# Altium footprint library kalios.PcbLib: 404 footprints (part 16 of 26)
Each footprint in its own frame and in the unit in brackets; x right, y up, seen from the top. Pads: shape width x height; smd on the part's side, far side on the other; paste and mask are expansions set on the pad; w line width, h text height; cw(c..) or ccw(c..) is an arc to the next point about the centre after c.
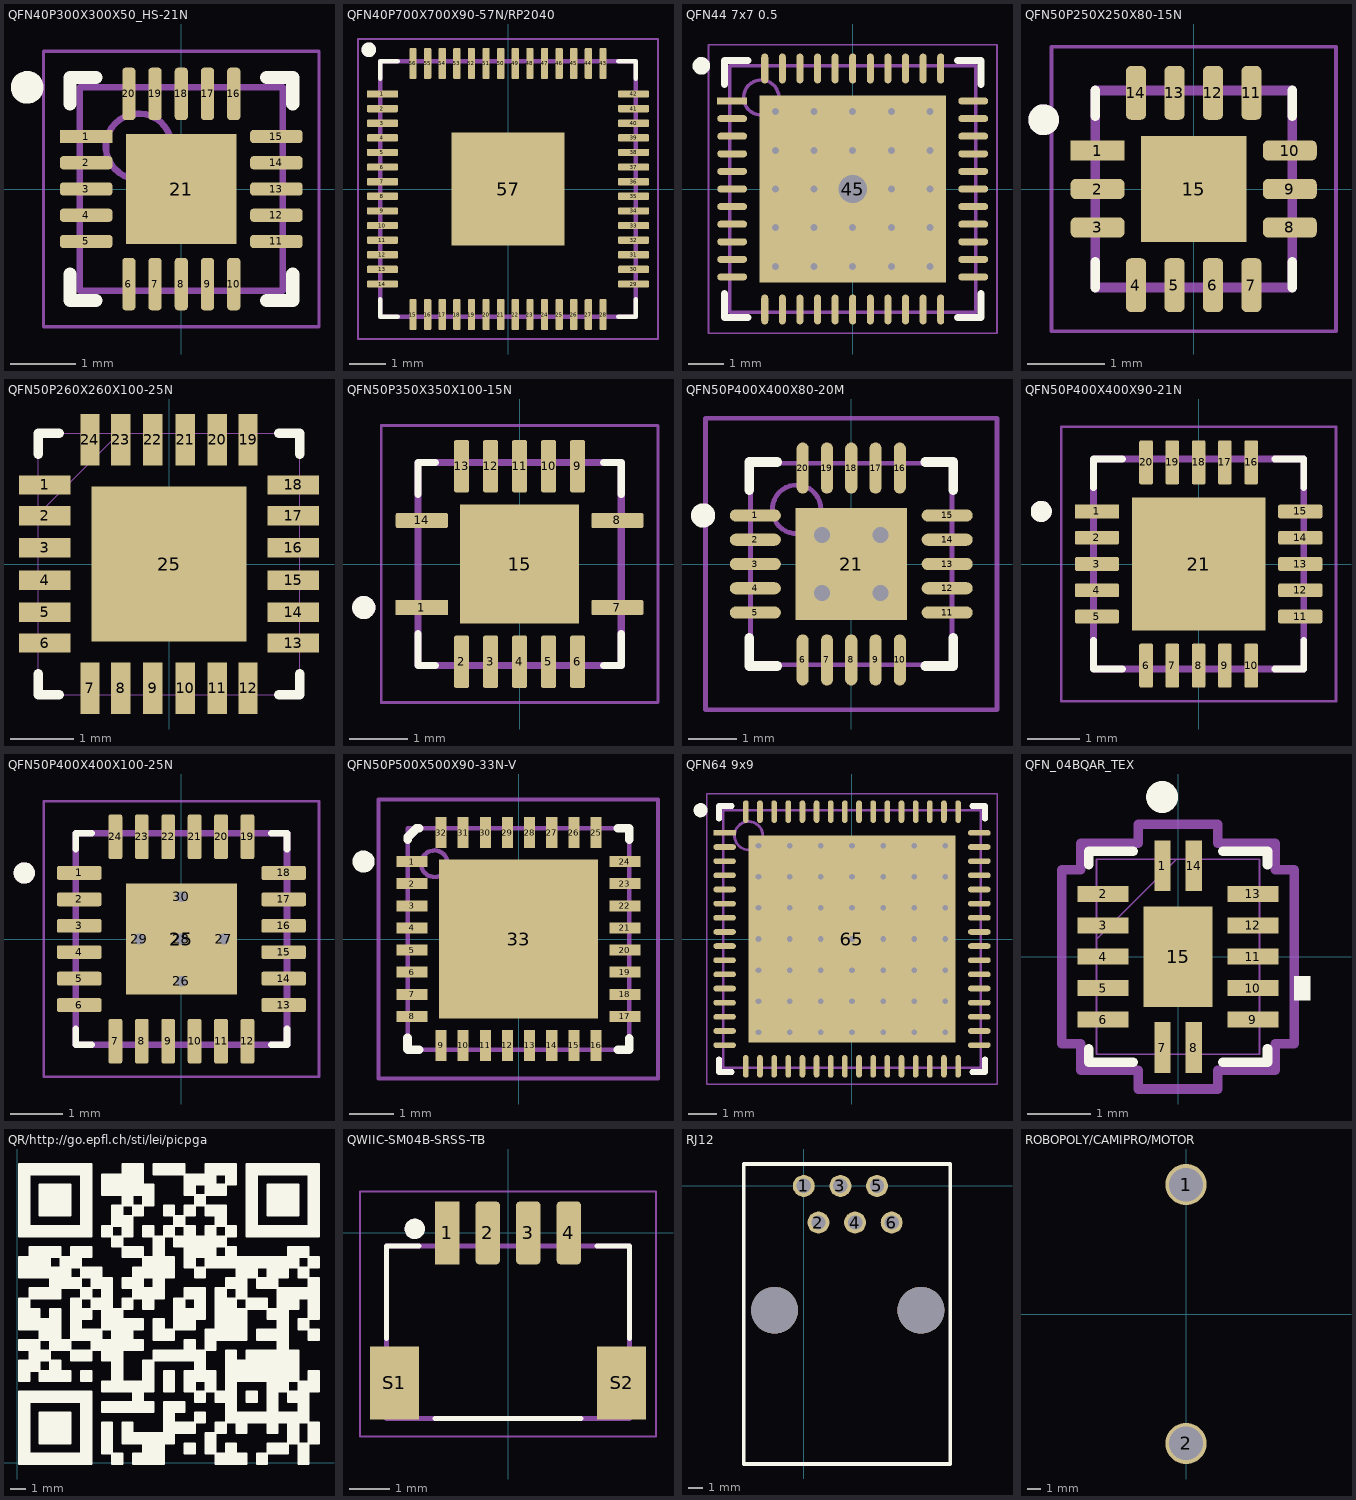
[diagram p15: the footprints below, top view; thin cyan lines are the x and y axes]

## QFN40P300X300X50_HS-21N [mm] "QFN, 20-Leads, Body 3.00x3.00mm, Pitch 0.40mm, Thermal Pad 1.68x1.68mm, IPC Medium Density"
height 0.5
pads (21):
  rect 0.8x0.2 smd: 1(-1.45,0.8)
  rrect50% 0.8x0.2 smd: 2(-1.45,0.4) 3(-1.45,0) 4(-1.45,-0.4) 5(-1.45,-0.8) 11(1.45,-0.8) 12(1.45,-0.4) 13(1.45,0) 14(1.45,0.4) 15(1.45,0.8)
  rrect50% 0.2x0.8 smd: 6(-0.8,-1.45) 7(-0.4,-1.45) 8(0,-1.45) 9(0.4,-1.45) 10(0.8,-1.45) 16(0.8,1.45) 17(0.4,1.45) 18(0,1.45) 19(-0.4,1.45) 20(-0.8,1.45)
  rect 1.68x1.68 smd: 21(0,0)
Top Overlay:
  circle w0.25: c-2.35,1.55 r0.125
  lines w0.2: -1.7,-1.3 -1.7,-1.7 -1.3,-1.7 ; -1.7,1.3 -1.7,1.7 -1.3,1.7 ; 1.3,-1.7 1.7,-1.7 1.7,-1.3 ; 1.3,1.7 1.7,1.7 1.7,1.3
Top 3D Body:
  circle w0.1: c-0.65,0.65 r0.5
  lines w0.1: -1.55,-1.55 -1.55,1.55 1.55,1.55 1.55,-1.55 -1.55,-1.55
Top Courtyard:
  lines w0.05: -2.1,-2.1 -2.1,2.1 2.1,2.1 2.1,-2.1 -2.1,-2.1
  lines w0.1: -0.5,0 0.5,0 ; 0,-0.5 0,0.5
Top Designator:
  text ".Designator" at -7.855,-0.508 h1.52
3D body "User Library-QFN-20-2.step": height 0.75, standoff 0, extent -1.524,-1.524 1.496,1.496

## QFN40P700X700X90-57N/RP2040 [mm]
pads (57):
  rect 0.84x0.2 smd: 1(-3.435,2.6)
  rrect25% 0.84x0.2 smd: 2(-3.435,2.2) 3(-3.435,1.8) 4(-3.435,1.4) 5(-3.435,1) 6(-3.435,0.6) 7(-3.435,0.2) 8(-3.435,-0.2) 9(-3.435,-0.6) 10(-3.435,-1) 11(-3.435,-1.4) 12(-3.435,-1.8) 13(-3.435,-2.2) 14(-3.435,-2.6) 29(3.435,-2.6) 30(3.435,-2.2) 31(3.435,-1.8) 32(3.435,-1.4) 33(3.435,-1) 34(3.435,-0.6) 35(3.435,-0.2) 36(3.435,0.2) 37(3.435,0.6) 38(3.435,1) 39(3.435,1.4) 40(3.435,1.8) 41(3.435,2.2) 42(3.435,2.6)
  rrect25% 0.2x0.84 smd: 15(-2.6,-3.435) 16(-2.2,-3.435) 17(-1.8,-3.435) 18(-1.4,-3.435) 19(-1,-3.435) 20(-0.6,-3.435) 21(-0.2,-3.435) 22(0.2,-3.435) 23(0.6,-3.435) 24(1,-3.435) 25(1.4,-3.435) 26(1.8,-3.435) 27(2.2,-3.435) 28(2.6,-3.435) 43(2.6,3.435) 44(2.2,3.435) 45(1.8,3.435) 46(1.4,3.435) 47(1,3.435) 48(0.6,3.435) 49(0.2,3.435) 50(-0.2,3.435) 51(-0.6,3.435) 52(-1,3.435) 53(-1.4,3.435) 54(-1.8,3.435) 55(-2.2,3.435) 56(-2.6,3.435)
  rect 3.1x3.1 smd paste-0.57: 57(0,0)
Top Overlay:
  circle w0.2: c-3.81,3.81 r0.1
  lines w0.127: -3.5,-3.02 -3.5,-3.5 -3.02,-3.5 ; -3.5,3.02 -3.5,3.5 -3.02,3.5 ; 3.02,-3.5 3.5,-3.5 3.5,-3.02 ; 3.02,3.5 3.5,3.5 3.5,3.02
Top 3D Body:
  circle w0.2: c-3.81,3.81 r0.1
  lines w0.127: -3.5,-3.5 3.5,-3.5 3.5,3.5 -3.5,3.5 -3.5,-3.5
Top Courtyard:
  lines w0.05: -4.105,-4.105 4.105,-4.105 4.105,4.105 -4.105,4.105 -4.105,-4.105
3D body "User Library-RP2040_QFN56_04.step": height 0.85, standoff -0.05, extent -3.52,-3.52 3.52,3.52

## QFN44 7x7 0.5 [mm]
height 0.9
pads (45):
  rect 0.85x0.2 smd: 1(-3.425,2.5)
  oval 0.85x0.2 smd: 2(-3.425,2) 3(-3.425,1.5) 4(-3.425,1) 5(-3.425,0.5) 6(-3.425,0) 7(-3.425,-0.5) 8(-3.425,-1) 9(-3.425,-1.5) 10(-3.425,-2) 11(-3.425,-2.5) 23(3.425,-2.5) 24(3.425,-2) 25(3.425,-1.5) 26(3.425,-1) 27(3.425,-0.5) 28(3.425,0) 29(3.425,0.5) 30(3.425,1) 31(3.425,1.5) 32(3.425,2) 33(3.425,2.5)
  oval 0.2x0.85 smd: 12(-2.5,-3.425) 13(-2,-3.425) 14(-1.5,-3.425) 15(-1,-3.425) 16(-0.5,-3.425) 17(0,-3.425) 18(0.5,-3.425) 19(1,-3.425) 20(1.5,-3.425) 21(2,-3.425) 22(2.5,-3.425) 34(2.5,3.425) 35(2,3.425) 36(1.5,3.425) 37(1,3.425) 38(0.5,3.425) 39(0,3.425) 40(-0.5,3.425) 41(-1,3.425) 42(-1.5,3.425) 43(-2,3.425) 44(-2.5,3.425)
  rect 5.3x5.3 smd: 45(0,0)
via 2.2,-2.2 diameter 0.5 hole 0.2
via 1.1,-2.2 diameter 0.5 hole 0.2
via 0,-2.2 diameter 0.5 hole 0.2
via -1.1,-2.2 diameter 0.5 hole 0.2
via -2.2,-2.2 diameter 0.5 hole 0.2
via 2.2,-1.1 diameter 0.5 hole 0.2
via 1.1,-1.1 diameter 0.5 hole 0.2
via 0,-1.1 diameter 0.5 hole 0.2
via -1.1,-1.1 diameter 0.5 hole 0.2
via -2.2,-1.1 diameter 0.5 hole 0.2
via 2.2,0 diameter 0.5 hole 0.2
via 1.1,0 diameter 0.5 hole 0.2
via 0,0 diameter 1 hole 0.8
via -1.1,0 diameter 0.5 hole 0.2
via -2.2,0 diameter 0.5 hole 0.2
via 2.2,1.1 diameter 0.5 hole 0.2
via 1.1,1.1 diameter 0.5 hole 0.2
via 0,1.1 diameter 0.5 hole 0.2
via -1.1,1.1 diameter 0.5 hole 0.2
via -2.2,1.1 diameter 0.5 hole 0.2
via 2.2,2.2 diameter 0.5 hole 0.2
via 1.1,2.2 diameter 0.5 hole 0.2
via 0,2.2 diameter 0.5 hole 0.2
via -1.1,2.2 diameter 0.5 hole 0.2
via -2.2,2.2 diameter 0.5 hole 0.2
Top Overlay:
  circle w0.25: c-4.3,3.5 r0.125
  lines w0.2: -3.65,-2.975 -3.65,-3.65 -2.975,-3.65 ; -3.65,2.975 -3.65,3.65 -2.975,3.65 ; 2.975,-3.65 3.65,-3.65 3.65,-2.975 ; 2.975,3.65 3.65,3.65 3.65,2.975
Top 3D Body:
  circle w0.1: c-2.6,2.6 r0.5
  lines w0.1: -3.5,-3.5 3.5,-3.5 3.5,3.5 -3.5,3.5 -3.5,-3.5
Top Courtyard:
  lines w0.05: -4.1,-4.1 4.1,-4.1 4.1,4.1 -4.1,4.1 -4.1,-4.1
  lines w0.1: -0.5,0 0.5,0 ; 0,-0.5 0,0.5
Top Designator:
  text ".Designator" at -7.83,-0.508 h1.52
3D body "QFN447x7.STEP": height 0.9, standoff 0, extent -3.501,-3.501 3.501,3.501

## QFN50P250X250X80-15N [mm]
pads (15):
  rect 0.7x0.26 smd: 1(-1.25,0.5)
  rrect50% 0.7x0.26 smd: 2(-1.25,0) 3(-1.25,-0.5) 8(1.25,-0.5) 9(1.25,0) 10(1.25,0.5)
  rrect50% 0.26x0.7 smd: 4(-0.75,-1.25) 5(-0.25,-1.25) 6(0.25,-1.25) 7(0.75,-1.25) 11(0.75,1.25) 12(0.25,1.25) 13(-0.25,1.25) 14(-0.75,1.25)
  rect 1.375x1.375 smd paste-0.199: 15(0,0)
Top Overlay:
  circle w0.2: c-1.95,0.9 r0.1
  lines w0.127: -1.28,-1.28 -1.28,-0.95 ; -1.28,0.95 -1.28,1.28 ; 1.28,-1.28 1.28,-0.95 ; 1.28,0.95 1.28,1.28
Top 3D Body:
  circle w0.2: c-1.95,0.9 r0.1
  lines w0.127: -1.28,-1.28 1.28,-1.28 1.28,1.28 -1.28,1.28 -1.28,-1.28
Top Courtyard:
  lines w0.05: -1.85,-1.85 1.85,-1.85 1.85,1.85 -1.85,1.85 -1.85,-1.85
Top Designator:
  text ".Designator" at -7.755,-0.508 h1.52

## QFN50P260X260X100-25N [mil]
pads (25):
  rect 32x12 smd: 1(-77,49) 2(-77,30) 3(-77,10) 4(-77,-10) 5(-77,-30) 6(-77,-49) 13(77,-49) 14(77,-30) 15(77,-10) 16(77,10) 17(77,30) 18(77,49)
  rect 12x32 smd: 7(-49,-77) 8(-30,-77) 9(-10,-77) 10(10,-77) 11(30,-77) 12(49,-77) 19(49,77) 20(30,77) 21(10,77) 22(-10,77) 23(-30,77) 24(-49,77)
  rect 96x96 smd: 25(0,0)
Top Overlay:
  lines w6: -81,-68 -81,-81 -68,-81 ; -81,68 -81,81 -68,81 ; 68,-81 81,-81 81,-68 ; 68,81 81,81 81,68
Top 3D Body:
  lines w0: -81,-55 -81,-43 ; -81,-35 -81,-24 ; -81,-16 -81,-4 ; -81,4 -81,16 ; -81,24 -81,35 ; -81,31 -31,81 ; -81,43 -81,55 ; -55,-81 -43,-81 ; -55,81 -43,81 ; -35,-81 -24,-81 ; -35,81 -24,81 ; -16,-81 -4,-81 ; -16,81 -4,81 ; 4,-81 16,-81 ; 4,81 16,81 ; 24,-81 35,-81 ; 24,81 35,81 ; 43,-81 55,-81 ; 43,81 55,81 ; 81,-55 81,-43 ; 81,-35 81,-24 ; 81,-16 81,-4 ; 81,4 81,16 ; 81,24 81,35 ; 81,43 81,55 ; -81,-81 -81,81 81,81 81,-81 -81,-81
Top Designator:
  text ".Designator" at -299.9,-19.99 h60
3D body "User Library-QFN24-0_5.STEP": height 39.37, standoff 0, extent -78.73,-78.73 78.74,78.75

## QFN50P350X350X100-15N [mm]
pads (15):
  rect 0.9x0.26 smd: 1(-1.685,-0.75)
  rrect25% 0.26x0.9 smd: 2(-1,-1.685) 3(-0.5,-1.685) 4(0,-1.685) 5(0.5,-1.685) 6(1,-1.685) 9(1,1.685) 10(0.5,1.685) 11(0,1.685) 12(-0.5,1.685) 13(-1,1.685)
  rrect25% 0.9x0.26 smd: 7(1.685,-0.75) 8(1.685,0.75) 14(-1.685,0.75)
  rect 2.05x2.05 smd paste-2: 15(0,0)
Top Overlay:
  circle w0.2: c-2.685,-0.75 r0.1
  lines w0.127: -1.75,-1.2 -1.75,-1.75 -1.45,-1.75 ; -1.75,1.2 -1.75,1.75 -1.45,1.75 ; 1.45,-1.75 1.75,-1.75 1.75,-1.2 ; 1.45,1.75 1.75,1.75 1.75,1.2
Top Paste:
  region: 0.65,-0.65 -0.65,-0.65 -0.65,0.65 0.65,0.65
Top 3D Body:
  circle w0.2: c-2.685,-0.75 r0.1
  lines w0.127: -1.75,-1.75 -1.75,1.75 1.75,1.75 1.75,-1.75 -1.75,-1.75
Top Courtyard:
  lines w0.05: -2.385,-2.385 -2.385,2.385 2.385,2.385 2.385,-2.385 -2.385,-2.385

## QFN50P400X400X80-20M [mm] "QFN, 20-Leads, Body 4.2x4.2mm (max), Pitch 0.50mm, IPC Low Density"
height 0.8
pads (21):
  oval 1.05x0.25 smd: 1(-1.975,1) 2(-1.975,0.5) 3(-1.975,0) 4(-1.975,-0.5) 5(-1.975,-1) 11(1.975,-1) 12(1.975,-0.5) 13(1.975,0) 14(1.975,0.5) 15(1.975,1)
  oval 0.25x1.05 smd: 6(-1,-1.975) 7(-0.5,-1.975) 8(0,-1.975) 9(0.5,-1.975) 10(1,-1.975) 16(1,1.975) 17(0.5,1.975) 18(0,1.975) 19(-0.5,1.975) 20(-1,1.975)
  rect 2.3x2.3 smd: 21(0,0)
via -0.6,0.6 diameter 0.66 hole 0.33
via 0.6,0.6 diameter 0.66 hole 0.33
via -0.6,-0.6 diameter 0.66 hole 0.33
via 0.6,-0.6 diameter 0.66 hole 0.33
Top Overlay:
  circle w0.25: c-3.05,1 r0.125
  lines w0.2: -2.1,-1.525 -2.1,-2.1 -1.525,-2.1 ; -2.1,1.525 -2.1,2.1 -1.525,2.1 ; 1.525,-2.1 2.1,-2.1 2.1,-1.525 ; 1.525,2.1 2.1,2.1 2.1,1.525
Top 3D Body:
  circle w0.1: c-1.125,1.125 r0.5
  lines w0.1: -2.075,-2.075 -2.075,2.075 2.075,2.075 2.075,-2.075 -2.075,-2.075
Top Courtyard:
  lines w0.1: -0.5,0 0.5,0 ; 0,-0.5 0,0.5 ; -3,-3 -3,3 3,3 3,-3 -3,-3
Top Designator:
  text ".Designator" at -7.743,-0.508 h1.52
3D body "QFN4x4_20pins.STEP": height 0.8, standoff 0, extent -2.02,-2.02 2.02,2.02

## QFN50P400X400X90-21N [mm]
pads (21):
  rect 0.84x0.26 smd: 1(-1.935,1)
  rrect25% 0.84x0.26 smd: 2(-1.935,0.5) 3(-1.935,0) 4(-1.935,-0.5) 5(-1.935,-1) 11(1.935,-1) 12(1.935,-0.5) 13(1.935,0) 14(1.935,0.5) 15(1.935,1)
  rrect25% 0.26x0.84 smd: 6(-1,-1.935) 7(-0.5,-1.935) 8(0,-1.935) 9(0.5,-1.935) 10(1,-1.935) 16(1,1.935) 17(0.5,1.935) 18(0,1.935) 19(-0.5,1.935) 20(-1,1.935)
  rect 2.54x2.54 smd paste-2: 21(0,0)
Top Overlay:
  circle w0.2: c-2.995,1 r0.1
  lines w0.127: -2,-1.45 -2,-2 -1.45,-2 ; -2,1.45 -2,2 -1.45,2 ; 1.45,-2 2,-2 2,-1.45 ; 1.45,2 2,2 2,1.45
Top Paste:
  region: 0.82,-0.82 -0.82,-0.82 -0.82,0.82 0.82,0.82
Top 3D Body:
  circle w0.2: c-2.995,1 r0.1
  lines w0.127: -2,-2 2,-2 2,2 -2,2 -2,-2
Top Courtyard:
  lines w0.05: -2.615,-2.615 2.615,-2.615 2.615,2.615 -2.615,2.615 -2.615,-2.615
3D body "step_temp.STEP": height 0.9, standoff 0, extent -2,-2 2,2

## QFN50P400X400X100-25N [mm]
pads (30):
  rrect25% 0.84x0.26 smd: 1(-1.935,1.25) 2(-1.935,0.75) 3(-1.935,0.25) 4(-1.935,-0.25) 5(-1.935,-0.75) 6(-1.935,-1.25) 13(1.935,-1.25) 14(1.935,-0.75) 15(1.935,-0.25) 16(1.935,0.25) 17(1.935,0.75) 18(1.935,1.25)
  rrect25% 0.26x0.84 smd: 7(-1.25,-1.935) 8(-0.75,-1.935) 9(-0.25,-1.935) 10(0.25,-1.935) 11(0.75,-1.935) 12(1.25,-1.935) 19(1.25,1.935) 20(0.75,1.935) 21(0.25,1.935) 22(-0.25,1.935) 23(-0.75,1.935) 24(-1.25,1.935)
  rect 2.1x2.1 smd paste-2: 25(0,0)
  round 0.4 hole 0.2: 26(0,-0.8) 27(0.8,0) 28(0,0) 29(-0.8,0) 30(0,0.8)
Top Overlay:
  circle w0.2: c-2.975,1.25 r0.1
  lines w0.127: -2,-1.7 -2,-2 -1.7,-2 ; -2,1.7 -2,2 -1.7,2 ; 1.7,-2 2,-2 2,-1.7 ; 1.7,2 2,2 2,1.7
Top Paste:
  region: 0.664,-0.664 -0.664,-0.664 -0.664,0.664 0.664,0.664
Top 3D Body:
  circle w0.2: c-2.975,1.25 r0.1
  lines w0.127: -2,-2 2,-2 2,2 -2,2 -2,-2
Top Courtyard:
  lines w0.05: -2.605,-2.605 2.605,-2.605 2.605,2.605 -2.605,2.605 -2.605,-2.605
Top Designator:
  text ".Designator" at -7.89,-0.508 h1.52
3D body "step_temp.STEP": height 1, standoff 0, extent -2,-2 2,2

## QFN50P500X500X90-33N-V [mm]
pads (33):
  rect 0.7x0.25 smd: 1(-2.4,1.75) 2(-2.4,1.25) 3(-2.4,0.75) 4(-2.4,0.25) 5(-2.4,-0.25) 6(-2.4,-0.75) 7(-2.4,-1.25) 8(-2.4,-1.75) 17(2.4,-1.75) 18(2.4,-1.25) 19(2.4,-0.75) 20(2.4,-0.25) 21(2.4,0.25) 22(2.4,0.75) 23(2.4,1.25) 24(2.4,1.75)
  rect 0.25x0.7 smd: 9(-1.75,-2.4) 10(-1.25,-2.4) 11(-0.75,-2.4) 12(-0.25,-2.4) 13(0.25,-2.4) 14(0.75,-2.4) 15(1.25,-2.4) 16(1.75,-2.4) 25(1.75,2.4) 26(1.25,2.4) 27(0.75,2.4) 28(0.25,2.4) 29(-0.25,2.4) 30(-0.75,2.4) 31(-1.25,2.4) 32(-1.75,2.4)
  rect 3.6x3.6 smd: 33(0,0)
Top Overlay:
  circle w0.25: c-3.5,1.75 r0.125
  lines w0.2: -2.504,-2.487 -2.504,-2.237 ; -2.5,-2.5 -2.25,-2.5 ; -2.5,2.25 -2.5,2.3 -2.3,2.5 -2.25,2.5 ; 2.25,-2.5 2.5,-2.5 2.5,-2.25 ; 2.25,2.5 2.5,2.5 2.5,2.25
Top 3D Body:
  circle w0.1: c-1.9,1.7 r0.3
  lines w0.1: -2.504,-2.5 -2.504,2.5 ; -2.5,-2.5 2.5,-2.5 2.5,2.5 -2.5,2.5 ; -0.5,0 0.5,0 ; 0,-0.5 0,0.5
Top Courtyard:
  lines w0.1: -3.162,-3.15 -3.162,3.15 ; -3.15,-3.15 3.15,-3.15 3.15,3.15 -3.15,3.15
Top Designator:
  text ".Designator" at -7.893,-0.508 h1.52
3D body "ATSAMC21E15A-MUT.STEP": height 1, standoff 0, extent -2.5,-2.5 2.5,2.5

## QFN64 9x9 [mm] "QFN, 64-Leads, Body 9.00x9.00mm, Pitch 0.50mm, Thermal Pad 7.30x7.30mm, IPC Medium Density"
height 1
pads (65):
  rect 0.8x0.2 smd: 1(-4.5,3.75)
  oval 0.8x0.2 smd: 2(-4.5,3.25) 3(-4.5,2.75) 4(-4.5,2.25) 5(-4.5,1.75) 6(-4.5,1.25) 7(-4.5,0.75) 8(-4.5,0.25) 9(-4.5,-0.25) 10(-4.5,-0.75) 11(-4.5,-1.25) 12(-4.5,-1.75) 13(-4.5,-2.25) 14(-4.5,-2.75) 15(-4.5,-3.25) 16(-4.5,-3.75) 33(4.5,-3.75) 34(4.5,-3.25) 35(4.5,-2.75) 36(4.5,-2.25) 37(4.5,-1.75) 38(4.5,-1.25) 39(4.5,-0.75) 40(4.5,-0.25) 41(4.5,0.25) 42(4.5,0.75) 43(4.5,1.25) 44(4.5,1.75) 45(4.5,2.25) 46(4.5,2.75) 47(4.5,3.25) 48(4.5,3.75)
  oval 0.2x0.8 smd: 17(-3.75,-4.5) 18(-3.25,-4.5) 19(-2.75,-4.5) 20(-2.25,-4.5) 21(-1.75,-4.5) 22(-1.25,-4.5) 23(-0.75,-4.5) 24(-0.25,-4.5) 25(0.25,-4.5) 26(0.75,-4.5) 27(1.25,-4.5) 28(1.75,-4.5) 29(2.25,-4.5) 30(2.75,-4.5) 31(3.25,-4.5) 32(3.75,-4.5) 49(3.75,4.5) 50(3.25,4.5) 51(2.75,4.5) 52(2.25,4.5) 53(1.75,4.5) 54(1.25,4.5) 55(0.75,4.5) 56(0.25,4.5) 57(-0.25,4.5) 58(-0.75,4.5) 59(-1.25,4.5) 60(-1.75,4.5) 61(-2.25,4.5) 62(-2.75,4.5) 63(-3.25,4.5) 64(-3.75,4.5)
  rect 7.3x7.3 smd: 65(0,0)
via 3.3,-3.3 diameter 0.5 hole 0.2
via 2.2,-3.3 diameter 0.5 hole 0.2
via 1.1,-3.3 diameter 0.5 hole 0.2
via 0,-3.3 diameter 0.5 hole 0.2
via -1.1,-3.3 diameter 0.5 hole 0.2
via -2.2,-3.3 diameter 0.5 hole 0.2
via -3.3,-3.3 diameter 0.5 hole 0.2
via 3.3,-2.2 diameter 0.5 hole 0.2
via 2.2,-2.2 diameter 0.5 hole 0.2
via 1.1,-2.2 diameter 0.5 hole 0.2
via 0,-2.2 diameter 0.5 hole 0.2
via -1.1,-2.2 diameter 0.5 hole 0.2
via -2.2,-2.2 diameter 0.5 hole 0.2
via -3.3,-2.2 diameter 0.5 hole 0.2
via 3.3,-1.1 diameter 0.5 hole 0.2
via 2.2,-1.1 diameter 0.5 hole 0.2
via 1.1,-1.1 diameter 0.5 hole 0.2
via 0,-1.1 diameter 0.5 hole 0.2
via -1.1,-1.1 diameter 0.5 hole 0.2
via -2.2,-1.1 diameter 0.5 hole 0.2
via -3.3,-1.1 diameter 0.5 hole 0.2
via 3.3,0 diameter 0.5 hole 0.2
via 2.2,0 diameter 0.5 hole 0.2
via 1.1,0 diameter 0.5 hole 0.2
via 0,0 diameter 0.5 hole 0.2
via -1.1,0 diameter 0.5 hole 0.2
via -2.2,0 diameter 0.5 hole 0.2
via -3.3,0 diameter 0.5 hole 0.2
via 3.3,1.1 diameter 0.5 hole 0.2
via 2.2,1.1 diameter 0.5 hole 0.2
via 1.1,1.1 diameter 0.5 hole 0.2
via 0,1.1 diameter 0.5 hole 0.2
via -1.1,1.1 diameter 0.5 hole 0.2
via -2.2,1.1 diameter 0.5 hole 0.2
via -3.3,1.1 diameter 0.5 hole 0.2
via 3.3,2.2 diameter 0.5 hole 0.2
via 2.2,2.2 diameter 0.5 hole 0.2
via 1.1,2.2 diameter 0.5 hole 0.2
via 0,2.2 diameter 0.5 hole 0.2
via -1.1,2.2 diameter 0.5 hole 0.2
via -2.2,2.2 diameter 0.5 hole 0.2
via -3.3,2.2 diameter 0.5 hole 0.2
via 3.3,3.3 diameter 0.5 hole 0.2
via 2.2,3.3 diameter 0.5 hole 0.2
via 1.1,3.3 diameter 0.5 hole 0.2
via 0,3.3 diameter 0.5 hole 0.2
via -1.1,3.3 diameter 0.5 hole 0.2
via -2.2,3.3 diameter 0.5 hole 0.2
via -3.3,3.3 diameter 0.5 hole 0.2
Top Overlay:
  circle w0.25: c-5.35,4.55 r0.125
  lines w0.2: -4.7,-4.25 -4.7,-4.7 -4.25,-4.7 ; -4.7,4.25 -4.7,4.7 -4.25,4.7 ; 4.25,-4.7 4.7,-4.7 4.7,-4.25 ; 4.25,4.7 4.7,4.7 4.7,4.25
Top 3D Body:
  circle w0.1: c-3.65,3.65 r0.5
  lines w0.1: -4.55,-4.55 4.55,-4.55 4.55,4.55 -4.55,4.55 -4.55,-4.55
Top Courtyard:
  lines w0.05: -5.125,-5.125 5.125,-5.125 5.125,5.125 -5.125,5.125 -5.125,-5.125
  lines w0.1: -0.5,0 0.5,0 ; 0,-0.5 0,0.5
Top Designator:
  text ".Designator" at -7.843,-0.508 h1.52
3D body "QFN64 9x9 (LAN9514).STEP": height 0.9, standoff 0, extent -4.5,-4.5 4.5,4.5

## QFN_04BQAR_TEX [mil]
pads (15):
  rect 10.03x31.81 smd paste+0 mask+0: 1(-9.85,56.91) 7(-9.85,-56.91) 8(9.85,-56.91) 14(9.85,56.91)
  rect 31.81x10.03 smd paste+0 mask+0: 2(-46.91,39.38) 3(-46.91,19.69) 4(-46.91,0) 5(-46.91,-19.69) 6(-46.91,-39.38) 9(46.91,-39.38) 10(46.91,-19.69) 11(46.91,0) 12(46.91,19.69) 13(46.91,39.38)
  rect 43x63 smd paste+0 mask+0: 15(0,0)
Top Overlay:
  circle w10: c-10,100 r5
  region: 72.81,-12.19 82.81,-12.19 82.81,-27.19 72.81,-27.19
  lines w6: -56,-57.5 -56,-66 -27.96,-66 ; -56,57.5 -56,66 -27.96,66 ; 27.96,-66 56,-66 56,-57.5 ; 27.96,66 56,66 56,57.5
Top 3D Body:
  lines w1: -51,11 -1,61 ; -51,-61 51,-61 51,61 -51,61 -51,-61 ; -51,-45.38 -51,-33.38 -51,-45.38 ; -51,-25.69 -51,-13.69 -51,-25.69 ; -51,-6 -51,6 -51,-6 ; -51,13.69 -51,25.69 -51,13.69 ; -51,33.38 -51,45.38 -51,33.38 ; -15.85,-61 -3.85,-61 -15.85,-61 ; -15.85,61 -3.85,61 -15.85,61 ; 3.85,-61 15.85,-61 3.85,-61 ; 3.85,61 15.85,61 3.85,61 ; 51,-45.38 51,-33.38 51,-45.38 ; 51,-25.69 51,-13.69 51,-25.69 ; 51,-6 51,6 51,-6 ; 51,13.69 51,25.69 51,13.69 ; 51,33.38 51,45.38 51,33.38
  text "*" at -22.34,16 h50
Top Courtyard:
  lines w6: -72.81,-54.4 -61,-54.4 -61,-71 -24.86,-71 -24.86,-82.81 24.86,-82.81 24.86,-71 61,-71 61,-54.4 72.81,-54.4 72.81,54.4 61,54.4 61,71 24.86,71 24.86,82.81 -24.86,82.81 -24.86,71 -61,71 -61,54.4 -72.81,54.4 -72.81,-54.4
3D body "QFN_04BQAR_TEX.step": height 32.09, standoff 0, extent -50.98,-60.98 50.98,60.98

## QR/http://go.epfl.ch/sti/lei/picpga [mm]
Top Overlay:
  drawing of 952 lines, arcs and shapes, not listed
Top Designator:
  text ".Designator" at 2.51,9.418 h1.52

## QWIIC-SM04B-SRSS-TB [mm]
pads (6):
  rect 0.6x1.55 smd: 1(-1.5,0)
  rrect30% 0.6x1.55 smd: 2(-0.5,0) 3(0.5,0) 4(1.5,0)
  rect 1.2x1.8 smd: S1(-2.8,-3.7) S2(2.8,-3.7)
Top Overlay:
  circle w0.3: c-2.3,0.1 r0.1
  lines w0.127: -3,-2.6 -3,-0.325 -2.2,-0.325 ; -1.8,-4.575 1.8,-4.575 ; 2.2,-0.325 3,-0.325 3,-2.6
Top 3D Body:
  circle w0.3: c-2.3,0.1 r0.1
  lines w0.127: -3,-4.575 -3,-0.325 3,-0.325 3,-4.575 -3,-4.575
Top Courtyard:
  lines w0.05: -3.65,-5.025 -3.65,1.025 3.65,1.025 3.65,-5.025 -3.65,-5.025
Top Designator:
  text ".Designator" at -3.899,1.267 h0.7
3D body "QWIIC-SM04B-SRSS-TB.STEP": height 2.94, standoff -0.02, extent -3,-4.597 3,0.353

## RJ12 [mil]
pads (8):
  round 60 hole 39.37: 1(0,0) 2(40,-100) 3(100,0) 4(140,-100) 5(200,0) 6(240,-100)
  round 127.95 hole 127.95: ""(-80,-340) ""(320,-340)
Top Overlay:
  lines w10: -164,-760 400,-760 400,60 -164.01,60 -164,-760
Top Designator:
  text ".Designator" at -181.91,-369.99 h60

## ROBOPOLY/CAMIPRO/MOTOR [mm]
pads (2):
  round 3 hole 2.45: 1(0,9.449) 2(0,-9.449)
Top Designator:
  text ".Designator" at -7.617,-0.508 h1.52
3D body "motor.STEP": height 42.65, standoff -1.05, extent -9.15,-11.75 9.15,11.75